# Altium footprint library Power_DiscreteSSR1.PcbLib: 45 footprints (part 3 of 3)
Each footprint in its own frame and in the unit in brackets; x right, y up, seen from the top. Pads: shape width x height; smd on the part's side, far side on the other; paste and mask are expansions set on the pad; w line width, h text height; cw(c..) or ccw(c..) is an arc to the next point about the centre after c.
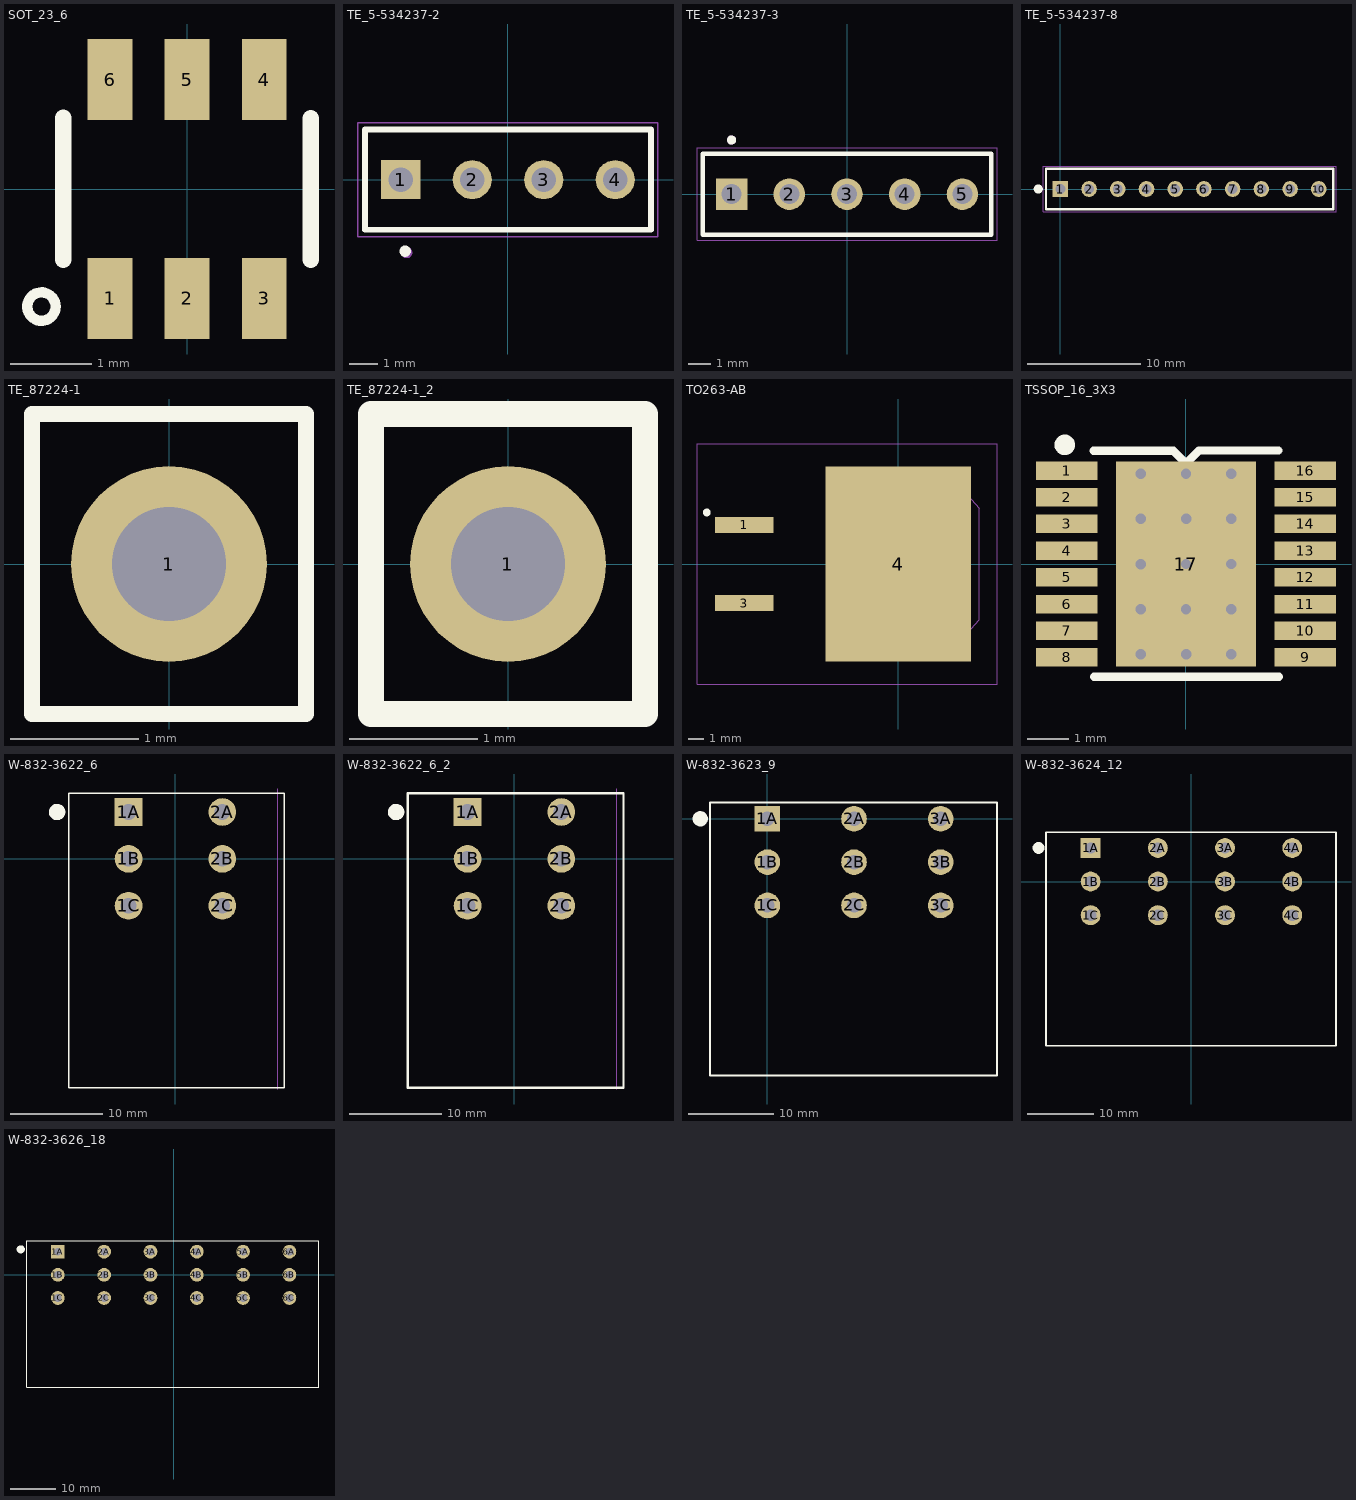
[diagram p2: the footprints below, top view; thin cyan lines are the x and y axes]

## SOT_23_6 [mm]
height 0.508
pads (6):
  rect 0.55x1 smd: 1(-0.95,-1.35) 2(0,-1.35) 3(0.95,-1.35) 4(0.95,1.35) 5(0,1.35) 6(-0.95,1.35)
Top Overlay:
  circle w0.127: c-1.795,-1.45 r0.175
  lines w0.203: -1.525,-0.875 -1.525,0.877 ; 1.525,-0.875 1.525,0.875
3D body: height 1.45, standoff 0, extent -1.53,-0.88 1.53,0.88

## TE_5-534237-2 [mm]
pads (4):
  rect 1.388x1.388 hole 0.88: 1(-3.81,0)
  round 1.388 hole 0.88: 2(-1.27,0) 3(1.27,0) 4(3.81,0)
Top Overlay:
  circle w0.2: c-3.653,-2.54 r0.1
  lines w0.203: -5.08,-1.78 -5.08,1.78 5.08,1.78 5.08,-1.78 -5.08,-1.78
Mechanical 13:
  circle w0.2: c-3.602,-2.591 r0.1
  lines w0.127: -5.08,-1.78 -5.08,1.78 5.08,1.78 5.08,-1.78 -5.08,-1.78
Mechanical 15:
  lines w0.05: -5.33,-2.03 -5.33,2.03 5.33,2.03 5.33,-2.03 -5.33,-2.03
3D body "5-534237-2--3DModel-STEP-1.STEP": height 8.7, standoff -2.86, extent -5.105,-1.778 5.055,1.778

## TE_5-534237-3 [mm]
pads (5):
  rect 1.388x1.388 hole 0.88: 1(-5.08,0)
  round 1.388 hole 0.88: 2(-2.54,0) 3(0,0) 4(2.54,0) 5(5.08,0)
Top Overlay:
  circle w0.2: c-5.08,2.38 r0.1
  lines w0.203: -6.35,-1.78 6.35,-1.78 6.35,1.78 -6.35,1.78 -6.35,-1.78
Mechanical 13:
  circle w0.2: c-5.08,2.38 r0.1
  lines w0.127: -6.35,-1.78 6.35,-1.78 6.35,1.78 -6.35,1.78 -6.35,-1.78
Mechanical 15:
  lines w0.05: -6.6,-2.03 6.6,-2.03 6.6,2.03 -6.6,2.03 -6.6,-2.03
3D body "5-534237-3--3DModel-STEP-1.STEP": height 8.7, standoff -2.86, extent -6.35,-1.778 6.35,1.778

## TE_5-534237-8 [mm]
pads (10):
  rect 1.388x1.388 hole 0.88: 1(0,0)
  round 1.388 hole 0.88: 2(2.54,0) 3(5.08,0) 4(7.62,0) 5(10.16,0) 6(12.7,0) 7(15.24,0) 8(17.78,0) 9(20.32,0) 10(22.86,0)
Top Overlay:
  circle w0.4: c-1.951,0 r0.2
  lines w0.203: -1.27,-1.78 -1.27,1.78 24.13,1.78 24.13,-1.78 -1.27,-1.78
Mechanical 13:
  lines w0.152: -1.27,-1.78 -1.27,1.78 24.13,1.78 24.13,-1.78 -1.27,-1.78
Mechanical 15:
  lines w0.05: -1.52,-2.03 -1.52,2.03 24.38,2.03 24.38,-2.03 -1.52,-2.03
3D body "5-534237-8--3DModel-STEP-1.STEP": height 8.7, standoff -2.86, extent -1.27,-1.702 24.13,1.854

## TE_87224-1 [mil]
pads (1):
  round 60 hole 35: 1(0,0)
Top Overlay:
  lines w5: -42,-46 42,-46 42,46 -42,46 -42,-46
3D body "c-87224-1-l-3d.stp": height 408.55, standoff -124.45, extent -42,-46 42,46

## TE_87224-1_2 [mil]
pads (1):
  round 60 hole 35: 1(0,0)
Top Overlay:
  lines w8: -42,-46 -42,46 42,46 42,-46 -42,-46
3D body "c-87224-1-l-3d.stp": height 408.55, standoff -124.45, extent -42,-46 42,46

## TO263-AB [mm]
height 4.4
pads (3):
  rect 3.8x1.05 smd: 1(-10,2.54) 3(-10,-2.54)
  rect 9.45x12.7 smd: 4(0,0)
Top Overlay:
  circle w0.25: c-12.446,3.353 r0.125
Top Paste:
  region: -1.14,-4.01 0.38,-4.01 0.38,-2.47 -1.14,-2.47
  region: 1.14,-4.01 2.66,-4.01 2.66,-2.47 1.14,-2.47
  region: -1.14,-1.85 0.38,-1.85 0.38,-0.31 -1.14,-0.31
  region: 1.14,-1.85 2.66,-1.85 2.66,-0.31 1.14,-0.31
  region: -1.14,0.31 0.38,0.31 0.38,1.85 -1.14,1.85
  region: 1.14,0.31 2.66,0.31 2.66,1.85 1.14,1.85
  region: -1.14,2.47 0.38,2.47 0.38,4.01 -1.14,4.01
  region: 1.14,2.47 2.66,2.47 2.66,4.01 1.14,4.01
Mechanical 7:
  text ".Designator" at -0.8,-0.4 h1.3
Mechanical 9:
  lines w0: 4.105,-4.508 4.491,-4.508 5.275,-3.639 5.275,3.638 4.491,4.507 4.105,4.507 ; -3.895,-4.698 4.105,-4.698 4.105,4.698 -3.895,4.698 -3.895,-4.698
Mechanical 13:
  lines w0.05: -3.96,-4.76 4.17,-4.76 4.17,4.76 -3.96,4.76 -3.96,-4.76
Mechanical 15:
  lines w0.05: -0.5,0 0.5,0 ; 0,-0.5 0,0.5 ; -13.081,-7.823 6.426,-7.823 6.426,7.823 -13.081,7.823 -13.081,-7.823
3D body: height 4.4, standoff 0, extent -3.959,-4.759 4.169,4.759

## TSSOP_16_3X3 [mm]
pads (17):
  rect 1.5x0.45 smd mask+0.05: 1(-2.9,2.275) 2(-2.9,1.625) 3(-2.9,0.975) 4(-2.9,0.325) 5(-2.9,-0.325) 6(-2.9,-0.975) 7(-2.9,-1.625) 8(-2.9,-2.275) 9(2.9,-2.275) 10(2.9,-1.625) 11(2.9,-0.975) 12(2.9,-0.325) 13(2.9,0.325) 14(2.9,0.975) 15(2.9,1.625) 16(2.9,2.275)
  rect 3.4x5 smd paste-5 mask-5: 17(0,0)
via -1.1,2.2 diameter 0.508 hole 0.254
via 0,2.2 diameter 0.508 hole 0.254
via 1.1,2.2 diameter 0.508 hole 0.254
via 1.1,1.1 diameter 0.508 hole 0.254
via 0.005,1.1 diameter 0.508 hole 0.254
via -1.1,1.1 diameter 0.508 hole 0.254
via -1.1,-2.2 diameter 0.508 hole 0.254
via -1.1,-1.1 diameter 0.508 hole 0.254
via 1.1,-1.1 diameter 0.508 hole 0.254
via 1.1,-2.2 diameter 0.508 hole 0.254
via 0.005,-2.2 diameter 0.508 hole 0.254
via 0,-1.1 diameter 0.508 hole 0.254
via -1.1,-0.005 diameter 0.508 hole 0.254
via 1.1,0 diameter 0.508 hole 0.254
via 0,0 diameter 0.508 hole 0.254
Top Overlay:
  circle w0.25: c-2.95,2.9 r0.125
  lines w0.203: -2.25,2.754 -0.304,2.754 0,2.45 0.312,2.762 2.25,2.762 ; -2.237,-2.741 2.263,-2.741
Top Paste:
  region: -1.49,1.5 -1.5,1.49 -1.5,-1.5 1.5,-1.5 1.5,1.5
Top Solder:
  region: -1.49,1.5 -1.5,1.49 -1.5,-1.5 1.5,-1.5 1.5,1.5
3D body "PWP16_3X3.step": height 1.7, standoff 0, extent -3.302,-2.553 3.302,2.553

## W-832-3622_6 [mm]
pads (6):
  rect 3x3 hole 1.702 mask+0: 1A(-5.08,5.08)
  round 3 hole 1.702 mask+0: 1B(-5.08,0) 1C(-5.08,-5.08) 2A(5.08,5.08) 2B(5.08,0) 2C(5.08,-5.08)
Top Overlay:
  circle w1.016: c-12.827,5.08 r0.381
  lines w0.152: -11.557,-24.811 11.811,-24.811 11.811,7.112 -11.557,7.112 -11.557,-24.811
Mechanical 15:
  lines w0: 11.062,-24.938 11.062,7.574
3D body: height 0.25, standoff 0, extent -5.08,5.08 -4.826,5.334
3D body "832-3622.stp": height 16.5, standoff -4, extent -11.603,-24.888 11.857,7.112

## W-832-3622_6_2 [mm]
pads (6):
  rect 3x3 hole 1.702 mask+0: 1A(-5.08,5.08)
  round 3 hole 1.702 mask+0: 1B(-5.08,0) 1C(-5.08,-5.08) 2A(5.08,5.08) 2B(5.08,0) 2C(5.08,-5.08)
Top Overlay:
  circle w1.016: c-12.827,5.08 r0.381
  lines w0.254: -11.557,-24.811 11.811,-24.811 11.811,7.112 -11.557,7.112 -11.557,-24.811
Mechanical 15:
  lines w0: 11.062,-24.938 11.062,7.574
3D body: height 0.25, standoff 0, extent -5.08,5.08 -4.826,5.334
3D body "832-3622.stp": height 16.5, standoff -4, extent -11.603,-24.888 11.857,7.112

## W-832-3623_9 [mm]
pads (9):
  rect 3x3 hole 1.702 mask+0: 1A(0,0)
  round 3 hole 1.702 mask+0: 1B(0,-5.08) 1C(0,-10.16) 2A(10.16,0) 2B(10.16,-5.08) 2C(10.16,-10.16) 3A(20.32,0) 3B(20.32,-5.08) 3C(20.32,-10.16)
Top Overlay:
  circle w1.016: c-7.874,0 r0.381
  lines w0.254: -6.731,-30.099 26.924,-30.099 26.924,1.905 -6.731,1.905 -6.731,-30.099
3D body: height 0.25, standoff 0, extent 0,0 0.254,0.254
3D body "832-3623.stp": height 16.5, standoff -4, extent -6.65,-30.095 26.97,1.905

## W-832-3624_12 [mm]
pads (12):
  rect 3x3 hole 1.702 mask+0: 1A(-15.24,5.08)
  round 3 hole 1.702 mask+0: 1B(-15.24,0) 1C(-15.24,-5.08) 2A(-5.08,5.08) 2B(-5.08,0) 2C(-5.08,-5.08) 3A(5.08,5.08) 3B(5.08,0) 3C(5.08,-5.08) 4A(15.24,5.08) 4B(15.24,0) 4C(15.24,-5.08)
Top Overlay:
  circle w1.016: c-23.114,5.08 r0.381
  lines w0.254: -21.971,-24.811 -21.971,7.447 21.844,7.447 21.844,-24.811 -21.971,-24.811
3D body: height 0.25, standoff 0, extent -15.24,5.08 -14.986,5.334
3D body "832-3624.stp": height 16.5, standoff -4, extent -22.017,-24.634 21.763,7.366

## W-832-3626_18 [mm]
pads (18):
  rect 3x3 hole 1.702 mask+0: 1A(-25.4,5.08)
  round 3 hole 1.702 mask+0: 1B(-25.4,0) 1C(-25.4,-5.08) 2A(-15.24,5.08) 2B(-15.24,0) 2C(-15.24,-5.08) 3A(-5.08,5.08) 3B(-5.08,0) 3C(-5.08,-5.08) 4A(5.08,5.08) 4B(5.08,0) 4C(5.08,-5.08) 5A(15.24,5.08) 5B(15.24,0) 5C(15.24,-5.08) 6A(25.4,5.08) 6B(25.4,0) 6C(25.4,-5.08)
Top Overlay:
  circle w1.016: c-33.528,5.588 r0.381
  lines w0.254: -32.258,-24.638 -32.258,7.447 31.877,7.447 31.877,-24.638 -32.258,-24.638
3D body "832-3626.stp": height 16.5, standoff -4, extent -32.177,-24.634 31.923,7.366
3D body: height 0.25, standoff 0, extent -25.4,5.08 -25.146,5.334